# Altium footprint library ALL.PcbLib: 385 footprints (part 15 of 25)
Each footprint in its own frame and in the unit in brackets; x right, y up, seen from the top. Pads: shape width x height; smd on the part's side, far side on the other; paste and mask are expansions set on the pad; w line width, h text height; cw(c..) or ccw(c..) is an arc to the next point about the centre after c.
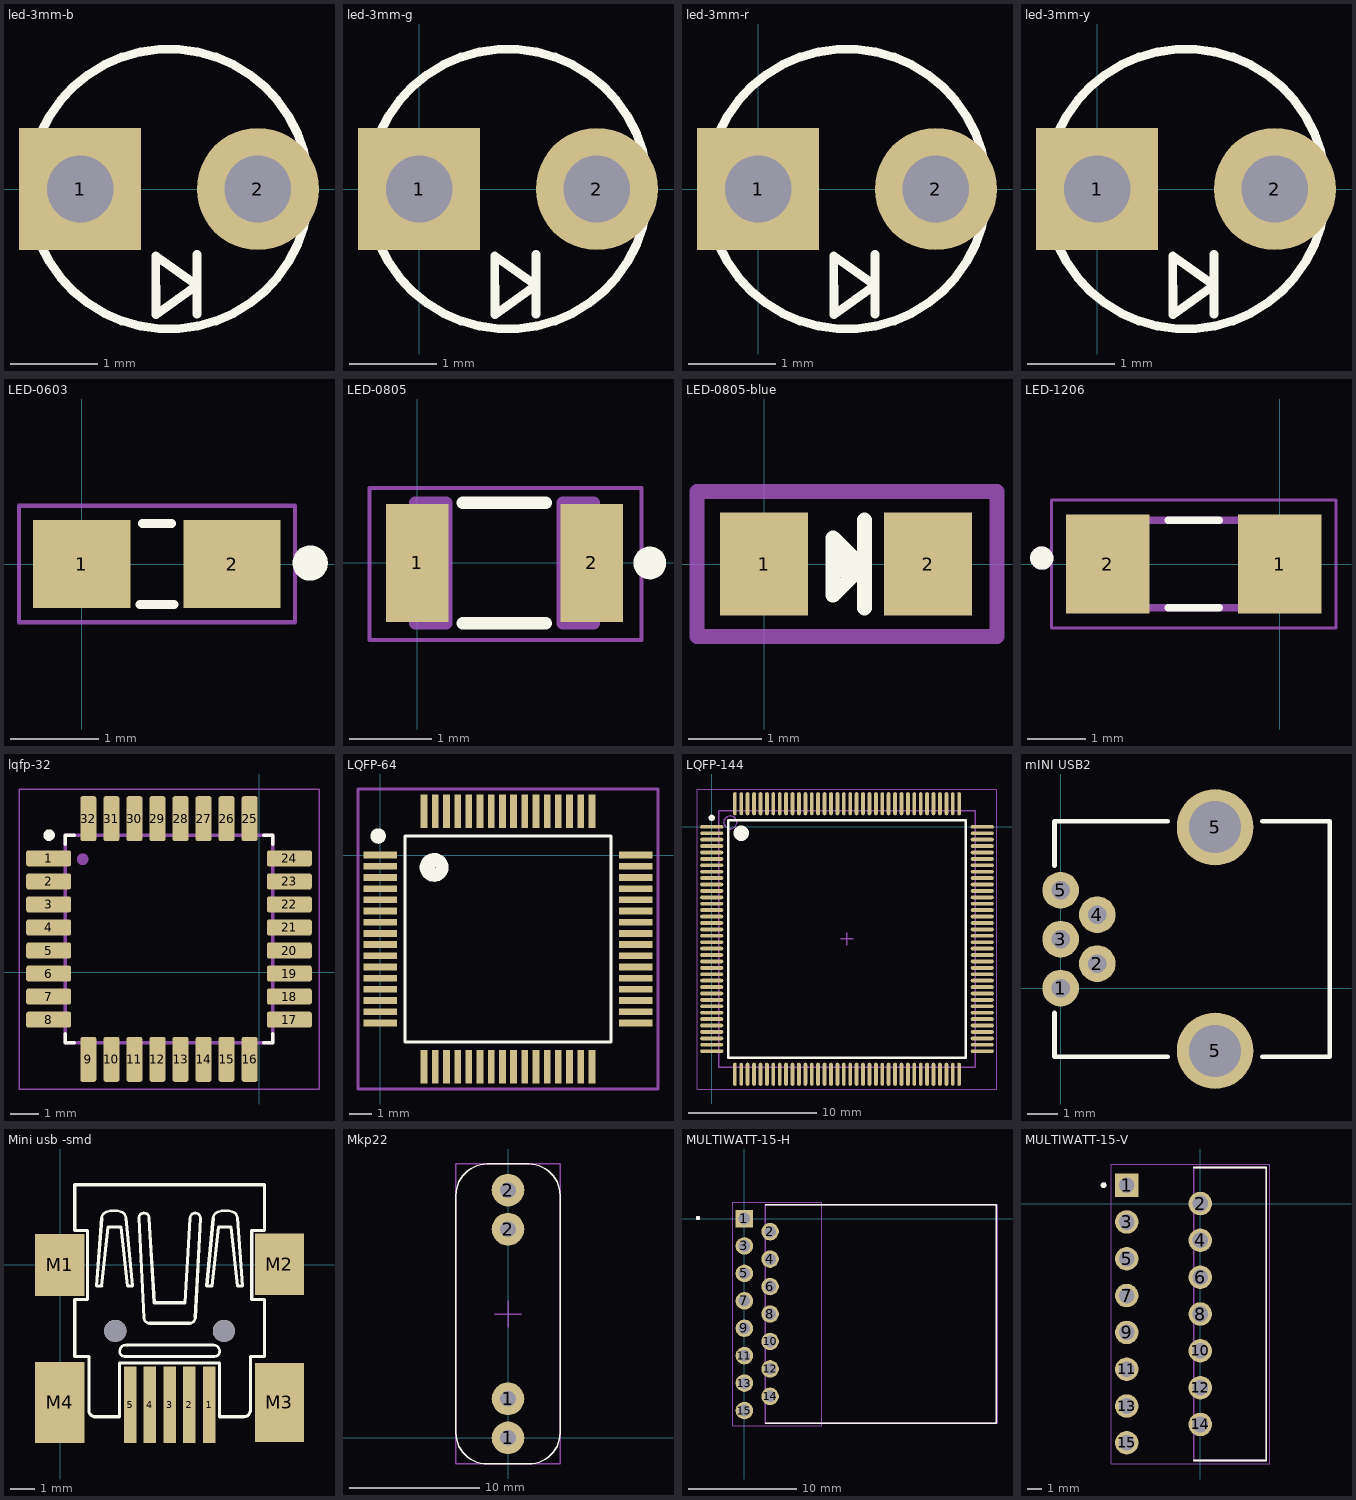
[diagram p14: the footprints below, top view; thin cyan lines are the x and y axes]

## led-3mm-b [mil]
pads (2):
  rect 55x55 hole 30: 1(343,0)
  round 55 hole 30: 2(423,0)
Top Overlay:
  circle w3.94: c383,0 r62.99
  lines w3.94: 377.09,-56.3 377.09,-30.09 395.6,-43.31 377.2,-56.45 ; 395.6,-56.3 395.6,-29.53

## led-3mm-g [mil]
pads (2):
  rect 55x55 hole 30: 1(0,0)
  round 55 hole 30: 2(80,0)
Top Overlay:
  circle w3.94: c40,0 r62.99
  lines w3.94: 34.09,-56.3 34.09,-30.09 52.6,-43.31 34.2,-56.45 ; 52.6,-56.3 52.6,-29.53
3D body "LED.STEP": height 153.55, standoff -59.05, extent -28.9,-69 108.9,68.8

## led-3mm-r [mil]
pads (2):
  rect 55x55 hole 30: 1(0,0)
  round 55 hole 30: 2(80,0)
Top Overlay:
  circle w3.94: c40,0 r62.99
  lines w3.94: 34.09,-56.3 34.09,-30.09 52.6,-43.31 34.2,-56.45 ; 52.6,-56.3 52.6,-29.53
3D body "ALSRobot-LED Red 3mm.step": height 212.6, standoff -110.24, extent -31.63,-76.58 106,80.58

## led-3mm-y [mil]
pads (2):
  rect 55x55 hole 30: 1(0,0)
  round 55 hole 30: 2(80,0)
Top Overlay:
  circle w3.94: c40,0 r62.99
  lines w3.94: 34.09,-56.3 34.09,-30.09 52.6,-43.31 34.2,-56.45 ; 52.6,-56.3 52.6,-29.53
3D body "User Library-LED 3mm Yellow 3mm Leads.STEP": height 153.15, standoff -117.72, extent -27.63,-78.44 108,73

## LED-0603 [mm]
pads (2):
  rect 1.1x1 smd: 1(0,0) 2(1.7,0)
Top Overlay:
  circle w0.2: c2.585,0.011 r0.1
  lines w0.102: 0.66,-0.457 1.041,-0.457 ; 0.686,0.457 1.016,0.457
Mechanical 13:
  region: 0.512,-0.471 0.01,-0.471 0.01,0.48 0.512,0.48
  region: 1.68,-0.47 1.181,-0.47 1.181,0.48 1.68,0.48
Mechanical 15:
  lines w0.05: 2.388,-0.66 -0.711,-0.66 -0.711,0.66 2.388,0.66 ; 2.413,-0.66 2.413,0.66
3D body "User Library-LED_0603_R.STEP": height 0.6, standoff 0, extent 0.038,-0.375 1.638,0.425

## LED-0805 [mil]
pads (2):
  rect 30x57 smd: 1(0,0) 2(84,0)
Top Overlay:
  circle w7.87: c112,0 r3.94
  lines w6: 22,-29 62,-29 ; 22,29 62,29
Mechanical 13:
  lines w6: -1,-29 -1,29 14,29 14,-29 -1,-29 ; 70,-29 85,-29 85,29 70,29 70,-29
Mechanical 15:
  lines w1.97: -23,-37 108,-37 108,36 -23,36 -23,-37
3D body "everlight-17-21-0805LED-red.STEP": height 31.5, standoff -12.2, extent 3.63,-24.61 82.37,24.61

## LED-0805-blue [mm]
pads (2):
  rect 1.2x1.4 smd: 1(0,0) 2(2.235,0)
Top Overlay:
  lines w0.203: 1.323,-0.045 0.942,-0.426 0.942,0.356 1.323,-0.025 ; 1.368,-0.6 1.368,0.6
  lines w0.305: 0.998,-0.025 1.28,-0.025
Mechanical 15:
  lines w0.203: -0.914,-0.991 -0.914,0.991 3.175,0.991 3.175,-0.991 -0.914,-0.991
3D body "User Library-LED0805.step": height 0.8, standoff 0, extent -0.009,-0.686 2.091,0.664

## LED-1206 [mm]
pads (2):
  rect 1.435x1.7 smd: 1(0,0) 2(-2.955,0)
Top Overlay:
  circle w0.2: c-4.089,0.102 r0.1
  lines w0.127: -1.917,-0.75 -1.038,-0.75 ; -1.917,0.75 -1.038,0.75
Mechanical 13:
  circle w0.2: c-4.089,0.102 r0.1
  lines w0.127: -2.977,-0.75 0.022,-0.75 0.022,0.75 -2.977,0.75 -2.977,-0.75
Mechanical 15:
  lines w0.05: -3.922,-1.1 0.967,-1.1 0.967,1.1 -3.922,1.1 -3.922,-1.1
3D body "1206-led.step": height 1.1, standoff 0, extent -3.124,-0.8 0.076,0.8

## lqfp-32 [mm]
pads (32):
  rrect25% 1.56x0.55 smd: 1(-7.322,3.962) 2(-7.322,3.162) 3(-7.322,2.362) 4(-7.322,1.562) 5(-7.322,0.762) 6(-7.322,-0.038) 7(-7.322,-0.838) 8(-7.322,-1.638) 17(1.038,-1.638) 18(1.038,-0.838) 19(1.038,-0.038) 20(1.038,0.762) 21(1.038,1.562) 22(1.038,2.362) 23(1.038,3.162) 24(1.038,3.962)
  rrect25% 0.55x1.56 smd: 9(-5.942,-3.018) 10(-5.142,-3.018) 11(-4.342,-3.018) 12(-3.542,-3.018) 13(-2.742,-3.018) 14(-1.942,-3.018) 15(-1.142,-3.018) 16(-0.342,-3.018) 25(-0.342,5.342) 26(-1.142,5.342) 27(-1.942,5.342) 28(-2.742,5.342) 29(-3.542,5.342) 30(-4.342,5.342) 31(-5.142,5.342) 32(-5.942,5.342)
Top Overlay:
  circle w0.2: c-7.308,4.769 r0.1
  lines w0.127: -6.742,-2.138 -6.742,-2.438 -6.442,-2.438 ; -6.742,4.462 -6.742,4.762 -6.442,4.762 ; 0.158,-2.438 0.458,-2.438 0.458,-2.138 ; 0.158,4.762 0.458,4.762 0.458,4.462
Mechanical 13:
  circle w0.2: c-6.142,3.932 r0.1
  lines w0.127: -6.742,-2.438 -6.742,4.762 0.458,4.762 0.458,-2.438 -6.742,-2.438
Mechanical 15:
  lines w0.05: -8.352,-4.048 -8.352,6.372 2.068,6.372 2.068,-4.048 -8.352,-4.048
3D body "User Library-LQFP32.STEP": height 1.63, standoff -0.09, extent -7.638,-3.363 1.362,5.637

## LQFP-64 [mm]
pads (64):
  rect 1.5x0.3 smd: 1(0,0) 2(0,-0.5) 3(0,-1) 4(0,-1.5) 5(0,-2) 6(0,-2.5) 7(0,-3) 8(0,-3.5) 9(0,-4) 10(0,-4.5) 11(0,-5) 12(0,-5.5) 13(0,-6) 14(0,-6.5) 15(0,-7) 16(0,-7.5) 33(11.4,-7.5) 34(11.4,-7) 35(11.4,-6.5) 36(11.4,-6) 37(11.4,-5.5) 38(11.4,-5) 39(11.4,-4.5) 40(11.4,-4) 41(11.4,-3.5) 42(11.4,-3) 43(11.4,-2.5) 44(11.4,-2) 45(11.4,-1.5) 46(11.4,-1) 47(11.4,-0.5) 48(11.4,0)
  rect 0.3x1.5 smd: 17(1.95,-9.45) 18(2.45,-9.45) 19(2.95,-9.45) 20(3.45,-9.45) 21(3.95,-9.45) 22(4.45,-9.45) 23(4.95,-9.45) 24(5.45,-9.45) 25(5.95,-9.45) 26(6.45,-9.45) 27(6.95,-9.45) 28(7.45,-9.45) 29(7.95,-9.45) 30(8.45,-9.45) 31(8.95,-9.45) 32(9.45,-9.45) 49(9.45,1.95) 50(8.95,1.95) 51(8.45,1.95) 52(7.95,1.95) 53(7.45,1.95) 54(6.95,1.95) 55(6.45,1.95) 56(5.95,1.95) 57(5.45,1.95) 58(4.95,1.95) 59(4.45,1.95) 60(3.95,1.95) 61(3.45,1.95) 62(2.95,1.95) 63(2.45,1.95) 64(1.95,1.95)
Top Overlay:
  circle w0.127: c-0.2,0.85 r0.1
  circle w0.127: c-0.1,0.85 r0.141
  circle w0.127: c-0.1,0.85 r0.1
  circle w0.127: c-0.1,0.85 r0.141
  circle w0.127: c-0.1,0.85 r0.224
  circle w0.127: c-0.1,0.85 r0.283
  circle w0.127: c2.3,-0.55 r0.1
  circle w0.127: c2.4,-0.55 r0.224
  circle w0.127: c2.4,-0.55 r0.141
  circle w0.127: c2.4,-0.55 r0.361
  circle w0.127: c2.4,-0.55 r0.283
  circle w0.127: c2.4,-0.55 r0.424
  circle w0.127: c2.4,-0.55 r0.5
  circle w0.127: c2.4,-0.55 r0.566
  circle w0.127: c2.4,-0.55 r0.583
  lines w0.127: 1.1,-8.35 1.1,0.85 10.3,0.85 10.3,-8.35 1.1,-8.35
Mechanical 15:
  lines w0.127: -1,-10.45 -1,2.95 12.4,2.95 12.4,-10.45 -1,-10.45
3D body "STM32F411RET6.STEP": height 1.56, standoff -0.04, extent -0.3,-9.75 11.7,2.25

## LQFP-144 [mm]
pads (144):
  oval 1.8x0.3 smd: 1(0,0) 2(0,-0.5) 3(0,-1) 4(0,-1.5) 5(0,-2) 6(0,-2.5) 7(0,-3) 8(0,-3.5) 9(0,-4) 10(0,-4.5) 11(0,-5) 12(0,-5.5) 13(0,-6) 14(0,-6.5) 15(0,-7) 16(0,-7.5) 17(0,-8) 18(0,-8.5) 19(0,-9) 20(0,-9.5) 21(0,-10) 22(0,-10.5) 23(0,-11) 24(0,-11.5) 25(0,-12) 26(0,-12.5) 27(0,-13) 28(0,-13.5) 29(0,-14) 30(0,-14.5) 31(0,-15) 32(0,-15.5) 33(0,-16) 34(0,-16.5) 35(0,-17) 36(0,-17.5) 73(21.1,-17.5) 74(21.1,-17) 75(21.1,-16.5) 76(21.1,-16) 77(21.1,-15.5) 78(21.1,-15) 79(21.1,-14.5) 80(21.1,-14) 81(21.1,-13.5) 82(21.1,-13) 83(21.1,-12.5) 84(21.1,-12) 85(21.1,-11.5) 86(21.1,-11) 87(21.1,-10.5) 88(21.1,-10) 89(21.1,-9.5) 90(21.1,-9) 91(21.1,-8.5) 92(21.1,-8) 93(21.1,-7.5) 94(21.1,-7) 95(21.1,-6.5) 96(21.1,-6) 97(21.1,-5.5) 98(21.1,-5) 99(21.1,-4.5) 100(21.1,-4) 101(21.1,-3.5) 102(21.1,-3) 103(21.1,-2.5) 104(21.1,-2) 105(21.1,-1.5) 106(21.1,-1) 107(21.1,-0.5) 108(21.1,0)
  oval 0.3x1.8 smd: 37(1.8,-19.3) 38(2.3,-19.3) 39(2.8,-19.3) 40(3.3,-19.3) 41(3.8,-19.3) 42(4.3,-19.3) 43(4.8,-19.3) 44(5.3,-19.3) 45(5.8,-19.3) 46(6.3,-19.3) 47(6.8,-19.3) 48(7.3,-19.3) 49(7.8,-19.3) 50(8.3,-19.3) 51(8.8,-19.3) 52(9.3,-19.3) 53(9.8,-19.3) 54(10.3,-19.3) 55(10.8,-19.3) 56(11.3,-19.3) 57(11.8,-19.3) 58(12.3,-19.3) 59(12.8,-19.3) 60(13.3,-19.3) 61(13.8,-19.3) 62(14.3,-19.3) 63(14.8,-19.3) 64(15.3,-19.3) 65(15.8,-19.3) 66(16.3,-19.3) 67(16.8,-19.3) 68(17.3,-19.3) 69(17.8,-19.3) 70(18.3,-19.3) 71(18.8,-19.3) 72(19.3,-19.3) 109(19.3,1.8) 110(18.8,1.8) 111(18.3,1.8) 112(17.8,1.8) 113(17.3,1.8) 114(16.8,1.8) 115(16.3,1.8) 116(15.8,1.8) 117(15.3,1.8) 118(14.8,1.8) 119(14.3,1.8) 120(13.8,1.8) 121(13.3,1.8) 122(12.8,1.8) 123(12.3,1.8) 124(11.8,1.8) 125(11.3,1.8) 126(10.8,1.8) 127(10.3,1.8) 128(9.8,1.8) 129(9.3,1.8) 130(8.8,1.8) 131(8.3,1.8) 132(7.8,1.8) 133(7.3,1.8) 134(6.8,1.8) 135(6.3,1.8) 136(5.8,1.8) 137(5.3,1.8) 138(4.8,1.8) 139(4.3,1.8) 140(3.8,1.8) 141(3.3,1.8) 142(2.8,1.8) 143(2.3,1.8) 144(1.8,1.8)
Top Overlay:
  circle w0.25: c0,0.7 r0.125
  circle w0.6: c2.3,-0.5 r0.3
  lines w0.2: 1.3,-18 1.3,0.5 19.8,0.5 19.8,-18 1.3,-18
Mechanical 13:
  circle w0.1: c1.45,0.35 r0.5
  lines w0.1: 0.55,-18.75 0.55,1.25 20.55,1.25 20.55,-18.75 0.55,-18.75
Mechanical 15:
  lines w0.05: -1.15,-20.45 -1.15,2.95 22.25,2.95 22.25,-20.45 -1.15,-20.45
  lines w0.1: 10.05,-8.75 11.05,-8.75 ; 10.55,-9.25 10.55,-8.25
3D body "LQFP144_STM32F4.STEP": height 1.92, standoff 0.02, extent -0.45,-19.75 21.55,2.25

## mINI USB2 [mm]
pads (7):
  round 1.2 hole 0.6: 1(0,0) 2(1.2,0.8) 3(0,1.6) 4(1.2,2.4) 5(0,3.2)
  round 2.5 hole 1.7: 5(5.05,-2.05) 5(5.05,5.26)
Top Overlay:
  lines w0.15: -0.2,-0.8 -0.2,-2.25 3.5,-2.25 ; -0.2,4 -0.2,5.45 3.5,5.45 ; 6.6,-2.25 8.8,-2.25 8.8,5.45 6.6,5.45
3D body "5877.STEP": height 3.95, standoff -1.8, extent -0.2,-2.25 8.8,5.45

## Mini usb -smd [mm]
pads (11):
  rect 0.5x3.1 smd: 1(6.025,-5.67) 2(5.225,-5.67) 3(4.425,-5.67) 4(3.625,-5.67) 5(2.825,-5.67)
  rect 2x2.5 smd: M1(-0.025,0) M2(8.875,0.025)
  rect 2x3.2 smd: M3(8.875,-5.57)
  rect 2x3.3 smd: M4(-0.025,-5.57)
  round 0.9 on Top hole 0.9: ""(2.225,-2.67) ""(6.625,-2.67)
Top Overlay:
  lines w0.102: 1.673,1.899 cw(c1.967,1.876) 1.881,2.158 cw(c2.167,1.227) 2.452,2.158 cw(c2.366,1.876) 2.66,1.899 ; 2.608,-3.708 cw(c2.608,-3.5) 2.4,-3.5 cw(c2.66,-3.5) 2.66,-3.241 ; 3.179,1.899 cw(c3.387,1.899) 3.387,2.106 cw(c3.387,1.899) 3.594,1.899 ; 3.387,-2.151 ccw(c3.606,-2.139) 3.594,-2.358 ; 5.255,-2.358 ccw(c5.243,-2.139) 5.463,-2.151 ; 5.255,1.899 cw(c5.463,1.899) 5.463,2.106 ; 5.463,2.106 cw(c5.463,1.899) 5.671,1.899 ; 6.19,-3.241 cw(c6.19,-3.5) 6.449,-3.5 cw(c6.242,-3.5) 6.242,-3.708 ; 6.19,1.899 cw(c6.484,1.876) 6.397,2.158 cw(c6.683,1.227) 6.968,2.158 cw(c6.882,1.876) 7.176,1.899
  lines w0.127: 0.583,-3.708 0.583,-1.399 1.097,-1.399 1.097,1.395 0.583,1.395 0.583,3.248 ; 0.589,-3.71 1.154,-3.71 1.154,-5.888 ccw(c1.414,-5.889) 1.414,-6.148 2.4,-6.148 2.4,-3.97 6.449,-3.97 6.449,-6.147 7.436,-6.147 ccw(c7.436,-5.887) 7.695,-5.887 7.695,-3.707 ; 1.673,1.899 1.466,-0.853 1.673,-0.853 1.933,1.535 2.452,1.535 2.712,-0.853 2.919,-0.853 2.66,1.899 ; 2.608,-3.708 6.242,-3.708 ; 2.66,-3.241 6.19,-3.241 ; 3.179,1.899 3.387,-2.151 ; 3.594,-2.358 5.255,-2.358 ; 3.594,1.899 3.802,-1.528 5.048,-1.528 ; 5.048,-1.528 5.255,1.899 ; 5.463,2.106 5.463,2.106 ; 5.463,-2.151 5.67,1.899 ; 6.19,1.899 5.93,-0.853 6.138,-0.853 6.397,1.535 6.916,1.535 7.176,-0.853 7.384,-0.853 7.176,1.899 ; 7.695,-3.71 8.26,-3.71 ; 8.266,-3.708 8.266,-1.399 7.752,-1.399 7.752,1.395 8.266,1.395 8.266,3.248 ; 8.266,1.745 8.266,3.248 ; 0.583,3.248 0.583,3.248 ; 0.583,3.248 8.266,3.248 ; 6.449,-3.5 6.449,-3.5
3D body "User Library-usb_mini_smd.step": height 4.14, standoff -0.95, extent -0.65,-5.98 9.25,3.22

## Mkp22 [mm]
pads (4):
  round 2.5 hole 1.2: 1(0,0) 1(0,3) 2(0,16) 2(0,19)
Top Overlay:
  lines w0.1: -4,0.413 ccw(c-1.587,0.413) -1.587,-2 0,-2 1.587,-2 ccw(c1.587,0.413) 4,0.413 4,18.587 ccw(c1.587,18.587) 1.587,21 0,21 -1.587,21 ccw(c-1.587,18.587) -4,18.587 -4,9.5 -4,0.413
Mechanical 15:
  lines w0.1: -1,9.5 1,9.5 ; 0,8.5 0,10.5 ; -4,-2 -4,21 4,21 4,-2 -4,-2
3D body "User Library-CBB81_W23_0_H14_5_T8_0_P19_0.STEP": height 17.5, standoff -10, extent -4,-1.999 4,21

## MULTIWATT-15-H [mm]
pads (15):
  rect 1.62x1.62 hole 1.08: 1(0,0)
  round 1.62 hole 1.08: 2(2.388,-1.219) 3(0,-2.54) 4(2.388,-3.759) 5(0,-5.08) 6(2.388,-6.299) 7(0,-7.62) 8(2.388,-8.839) 9(0,-10.16) 10(2.388,-11.379) 11(0,-12.7) 12(2.388,-13.919) 13(0,-15.24) 14(2.388,-16.459) 15(0,-17.78)
Top Overlay:
  circle w0.2: c-4.282,0.051 r0.1
  lines w0.127: 1.938,-18.939 23.317,-18.939 23.317,1.261 1.938,1.261
Mechanical 13:
  circle w0.2: c-4.282,0.051 r0.1
  lines w0.127: 1.938,-18.939 1.938,1.261 23.393,1.261 23.393,-18.939 1.938,-18.939
Mechanical 15:
  lines w0.05: -1.067,-19.189 -1.067,1.511 7.188,1.511 7.188,-19.189 -1.067,-19.189
3D body "User Library-Multiwatt15H.STEP": height 5, standoff -1.5, extent -0.331,-18.635 23.269,0.965

## MULTIWATT-15-V [mm]
pads (15):
  rect 1.62x1.62 hole 1.08: 1(-5.08,1.27)
  round 1.62 hole 1.08: 2(0,0) 3(-5.08,-1.27) 4(0,-2.54) 5(-5.08,-3.81) 6(0,-5.08) 7(-5.08,-6.35) 8(0,-7.62) 9(-5.08,-8.89) 10(0,-10.16) 11(-5.08,-11.43) 12(0,-12.7) 13(-5.08,-13.97) 14(0,-15.24) 15(-5.08,-16.51)
Top Overlay:
  circle w0.2: c-6.67,1.27 r0.1
  lines w0.127: -0.45,-17.72 4.55,-17.72 4.55,2.48 -0.45,2.48
Mechanical 13:
  circle w0.2: c-6.67,1.27 r0.1
  lines w0.127: -0.45,-17.72 -0.45,2.48 4.55,2.48 4.55,-17.72 -0.45,-17.72
Mechanical 15:
  lines w0.05: -6.14,-17.97 -6.14,2.73 4.8,2.73 4.8,-17.97 -6.14,-17.97
3D body "L298N--3DModel-STEP-56544.STEP": height 22.58, standoff -2.39, extent -5.207,-17.72 4.683,2.48